# Altium footprint library Tomra_Cadstar_Footprints.PcbLib: 380 footprints (part 16 of 24)
Each footprint in its own frame and in the unit in brackets; x right, y up, seen from the top. Pads: shape width x height; smd on the part's side, far side on the other; paste and mask are expansions set on the pad; w line width, h text height; cw(c..) or ccw(c..) is an arc to the next point about the centre after c.
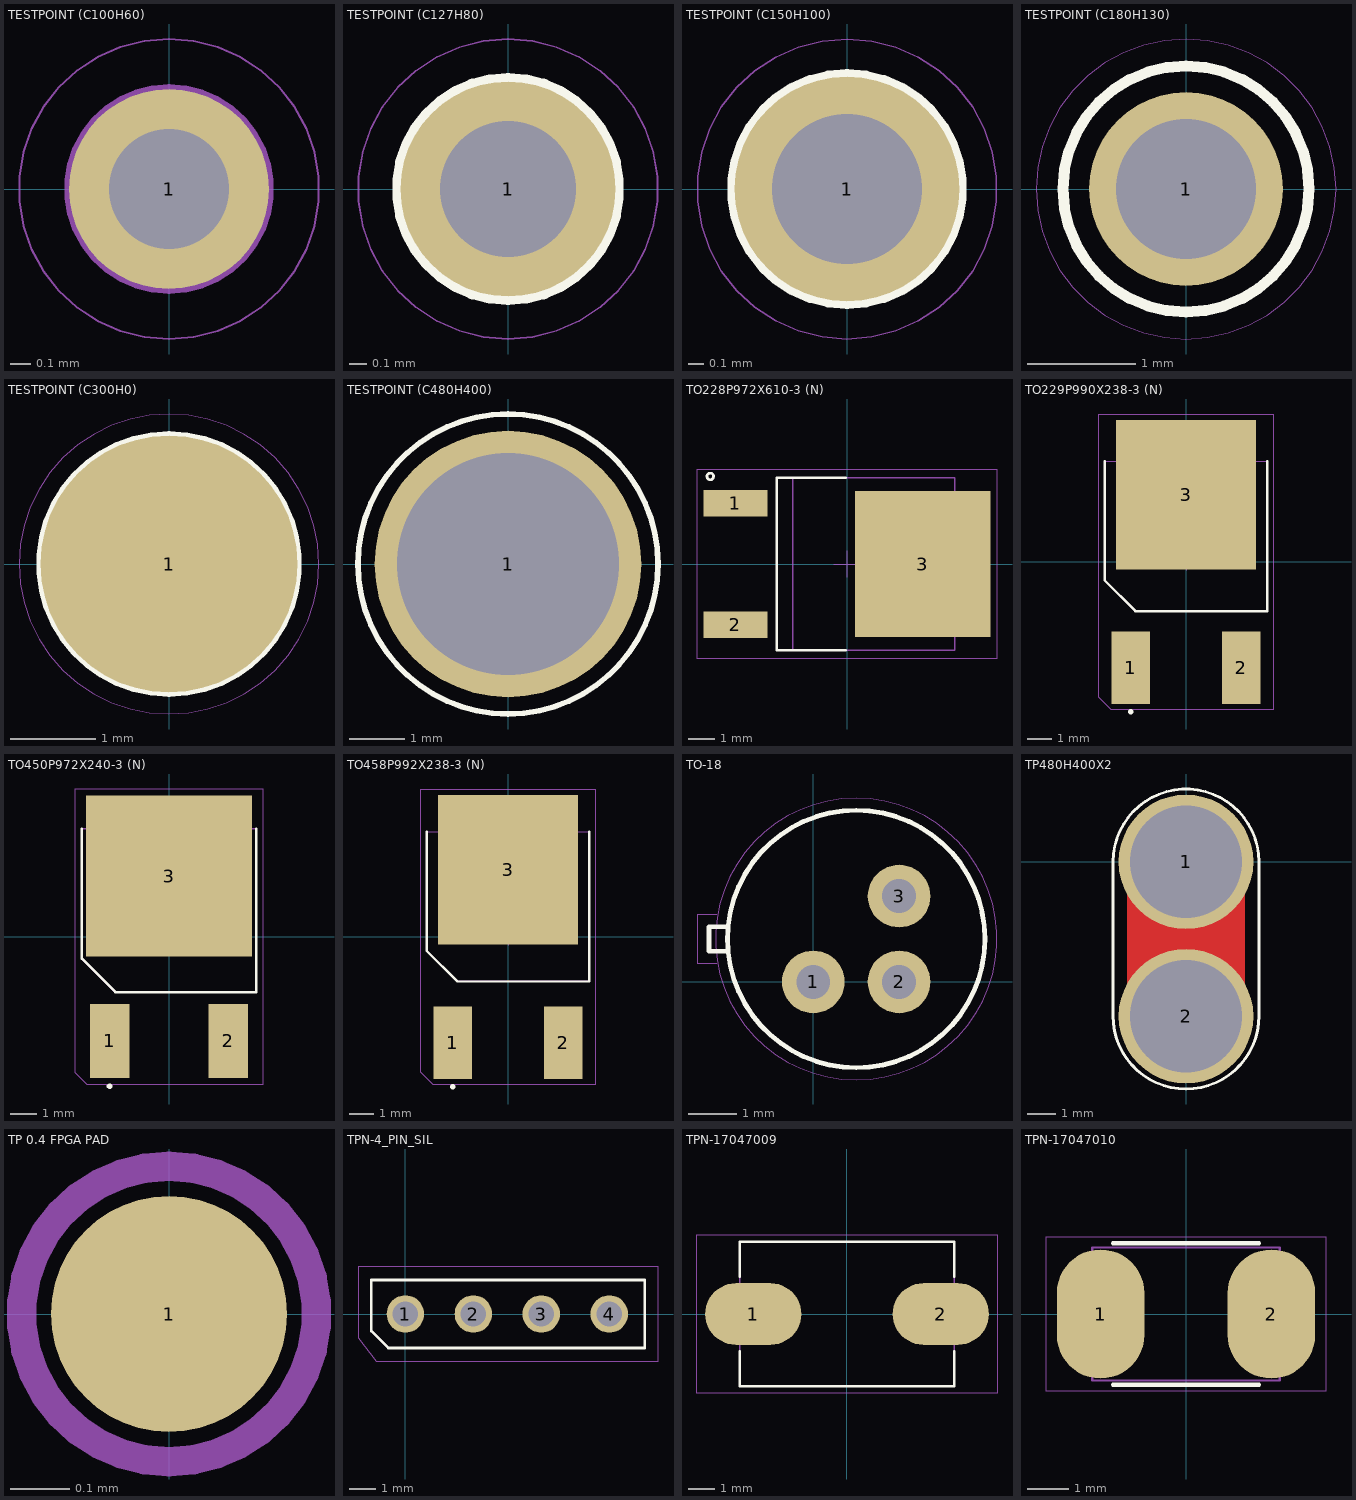
[diagram p15: the footprints below, top view; thin cyan lines are the x and y axes]

## TESTPOINT (C100H60) [mm]
pads (1):
  round 1 / inner round 1.524 / far side round 1 hole 0.6 paste+0 mask+0: 1(0,0)
Top Silk:
  text ".Designator" at 0,0 h0.7
Top Assembly:
  lines w0.05: 0,-0.5 cw(c0,0) 0,0.5 cw(c0,0) 0,-0.5
Top Placement:
  lines w0.01: 0,-0.75 cw(c0,0) 0,0.75 cw(c0,0) 0,-0.75

## TESTPOINT (C127H80) [mm]
pads (1):
  round 1.27 / inner round 1.524 / far side round 1.27 hole 0.8 paste+0 mask+0: 1(0,0)
Top Silk:
  lines w0.1: 0,-0.635 cw(c0,0) 0,0.635 cw(c0,0) 0,-0.635
  text ".Designator" at 0,0 h0.7
Top Assembly:
  lines w0.05: 0,-0.635 cw(c0,0) 0,0.635 cw(c0,0) 0,-0.635
Top Placement:
  lines w0.01: 0,-0.885 cw(c0,0) 0,0.885 cw(c0,0) 0,-0.885

## TESTPOINT (C150H100) [mm]
pads (1):
  round 1.5 / inner round 1.524 / far side round 1.5 hole 1 paste+0 mask+0: 1(0,0)
Top Silk:
  lines w0.1: 0,-0.75 cw(c0,0) 0,0.75 cw(c0,0) 0,-0.75
  text ".Designator" at 0,0 h0.7
Top Assembly:
  lines w0.05: 0,-0.75 cw(c0,0) 0,0.75 cw(c0,0) 0,-0.75
Top Placement:
  lines w0.01: 0,-1 cw(c0,0) 0,1 cw(c0,0) 0,-1

## TESTPOINT (C180H130) [mm]
pads (1):
  round 1.8 / inner round 1.524 / far side round 1.8 hole 1.3 paste+0 mask+0: 1(0,0)
Top Silk:
  lines w0.1: 0,-1.143 cw(c0,0) 0,1.143 cw(c0,0) 0,-1.143
  text ".Designator" at 0,0 h0.7
Top Assembly:
  lines w0.05: 0,-1.143 cw(c0,0) 0,1.143 cw(c0,0) 0,-1.143
Top Placement:
  lines w0.01: 0,-1.393 cw(c0,0) 0,1.393 cw(c0,0) 0,-1.393

## TESTPOINT (C300H0) [mm]
pads (1):
  round 3 smd paste-3 mask+0: 1(0,0)
Top Silk:
  lines w0.1: 0,-1.5 cw(c0,0) 0,1.5 cw(c0,0) 0,-1.5
  text ".Designator" at 0,0 h0.7
Top Assembly:
  lines w0.05: 0,-1.5 cw(c0,0) 0,1.5 cw(c0,0) 0,-1.5
Top Placement:
  lines w0.01: 0,-1.75 cw(c0,0) 0,1.75 cw(c0,0) 0,-1.75

## TESTPOINT (C480H400) [mm]
pads (1):
  round 4.8 / inner round 1.524 / far side round 4.8 hole 4 paste+0 mask+0: 1(0,0)
Top Silk:
  lines w0.05: 0,-2.7 cw(c0,0) 0,2.7 cw(c0,0) 0,-2.7
  lines w0.1: 0,-2.7 cw(c0,0) 0,2.7 cw(c0,0) 0,-2.7
Top Assembly:
  lines w0.05: 0,-2.7 cw(c0,0) 0,2.7 ; 0,-2.7 ccw(c0,0) 0,2.7 ; 0,-2.7 cw(c0,0) 0,2.7 ; 0,-2.7 ccw(c0,0) 0,2.7
  text ".Designator" at -2.3,2.68 h0.7
Top Placement:
  lines w0.01: 0,-2.7 cw(c0,0) 0,2.7 cw(c0,0) 0,-2.7

## TO228P972X610-3 (N) [mm]
height 2.4
pads (3):
  rect 2.4x1 smd paste+0 mask+0: 1(-4.2,2.28) 2(-4.2,-2.28)
  rect 5.1x5.5 smd paste+0 mask+0: 3(2.85,0)
Top Silk:
  lines w0.1: -0.05,-3.25 -2.65,-3.25 -2.65,3.25 -0.05,3.25 ; -5.275,3.3 cw(c-5.15,3.3) -5.025,3.3 cw(c-5.15,3.3) -5.275,3.3
  text ".Designator" at -3.599,-0.35 h0.7
Top Assembly:
  lines w0.05: 4.062,-2.65 4.59,-2.65 4.862,-2.05 4.862,2.05 4.59,2.65 4.062,2.65 ; -2.038,-3.25 4.062,-3.25 4.062,3.25 -2.038,3.25 -2.038,-3.25
Top Placement:
  lines w0.01: -0.5,0 0.5,0 ; 0,-0.5 0,0.5 ; -5.65,-3.55 5.65,-3.55 5.65,3.55 -5.65,3.55 -5.65,-3.55

## TO229P990X238-3 (N) [mm]
height 2.38
pads (3):
  rect 1.6x3 smd paste+0 mask+0: 1(-2.29,-4.39) 2(2.29,-4.39)
  rect 5.8x6.2 smd paste+0 mask+0: 3(0,2.79)
Top Silk:
  region: -2.39,-6.21 -2.39,-6.169 -2.331,-6.11 -2.249,-6.11 -2.19,-6.169 -2.19,-6.21 -2.19,-6.251 -2.249,-6.31 -2.331,-6.31 -2.39,-6.251
  lines w0.1: -3.37,4.182 -3.37,-0.768 -2.1,-2.038 3.37,-2.038 3.37,4.182
  text ".Designator" at 0,0 h0.7
Top Paste:
  region: 2.615,-0.02 1.265,-0.02 1.265,1.46 2.615,1.46
  region: 2.615,2.05 1.265,2.05 1.265,3.53 2.615,3.53
  region: 2.615,4.12 1.265,4.12 1.265,5.6 2.615,5.6
  region: 0.675,-0.02 -0.675,-0.02 -0.675,1.46 0.675,1.46
  region: 0.675,2.05 -0.675,2.05 -0.675,3.53 0.675,3.53
  region: 0.675,4.12 -0.675,4.12 -0.675,5.6 0.675,5.6
  region: -1.265,-0.02 -2.615,-0.02 -2.615,1.46 -1.265,1.46
  region: -1.265,2.05 -2.615,2.05 -2.615,3.53 -1.265,3.53
  region: -1.265,4.12 -2.615,4.12 -2.615,5.6 -1.265,5.6
Top Assembly:
  lines w0.05: -3.37,-0.768 -2.1,-2.038 3.37,-2.038 3.37,4.182 -3.37,4.182 -3.37,-0.768
Top Placement:
  lines w0.01: -3.62,-5.62 -3.1,-6.14 3.62,-6.14 3.62,6.14 -3.62,6.14 -3.62,-5.62
  lines w0.05: -0.35,0 0.35,0 ; 0,-0.35 0,0.35 ; -0.25,0 cw(c0,0) 0.25,0 cw(c0,0) -0.25,0

## TO450P972X240-3 (N) [mm]
height 2.4
pads (3):
  rect 1.5x2.8 smd paste+0 mask+0: 1(-2.25,-3.95) 2(2.25,-3.95)
  rect 6.3x6.1 smd paste+0 mask+0: 3(0,2.3)
Top Silk:
  region: -2.35,-5.67 -2.35,-5.629 -2.291,-5.57 -2.209,-5.57 -2.15,-5.629 -2.15,-5.67 -2.15,-5.711 -2.209,-5.77 -2.291,-5.77 -2.35,-5.711
  lines w0.1: -3.3,4.1 -3.3,-0.83 -2.03,-2.1 3.3,-2.1 3.3,4.1
  text ".Designator" at -3.55,5.6 h0.7
Top Assembly:
  lines w0.05: -3.3,-0.83 -2.03,-2.1 3.3,-2.1 3.3,4.1 -3.3,4.1 -3.3,-0.83
Top Placement:
  lines w0.01: -0.35,0 0.35,0 ; 0,-0.35 0,0.35 ; -3.55,-5.15 -3.1,-5.6 3.55,-5.6 3.55,5.6 -3.55,5.6 -3.55,-5.15 ; -0.25,0 cw(c0,0) 0.25,0 cw(c0,0) -0.25,0

## TO458P992X238-3 (N) [mm]
height 2.38
pads (3):
  rect 1.6x3 smd paste+0 mask+0: 1(-2.29,-4.39) 2(2.29,-4.39)
  rect 5.8x6.2 smd paste+0 mask+0: 3(0,2.79)
Top Silk:
  region: -2.39,-6.21 -2.39,-6.169 -2.331,-6.11 -2.249,-6.11 -2.19,-6.169 -2.19,-6.21 -2.19,-6.251 -2.249,-6.31 -2.331,-6.31 -2.39,-6.251
  lines w0.1: -3.37,4.372 -3.37,-0.577 -2.1,-1.847 3.37,-1.847 3.37,4.372
  text ".Designator" at 0,0 h0.7
Top Paste:
  region: 2.615,-0.02 1.265,-0.02 1.265,1.46 2.615,1.46
  region: 2.615,2.05 1.265,2.05 1.265,3.53 2.615,3.53
  region: 2.615,4.12 1.265,4.12 1.265,5.6 2.615,5.6
  region: 0.675,-0.02 -0.675,-0.02 -0.675,1.46 0.675,1.46
  region: 0.675,2.05 -0.675,2.05 -0.675,3.53 0.675,3.53
  region: 0.675,4.12 -0.675,4.12 -0.675,5.6 0.675,5.6
  region: -1.265,-0.02 -2.615,-0.02 -2.615,1.46 -1.265,1.46
  region: -1.265,2.05 -2.615,2.05 -2.615,3.53 -1.265,3.53
  region: -1.265,4.12 -2.615,4.12 -2.615,5.6 -1.265,5.6
Top Assembly:
  lines w0.05: -3.37,-0.577 -2.1,-1.847 3.37,-1.847 3.37,4.372 -3.37,4.372 -3.37,-0.577
Top Placement:
  lines w0.01: -3.62,-5.62 -3.1,-6.14 3.62,-6.14 3.62,6.14 -3.62,6.14 -3.62,-5.62
  lines w0.05: -0.35,0 0.35,0 ; 0,-0.35 0,0.35 ; -0.25,0 cw(c0,0) 0.25,0 cw(c0,0) -0.25,0

## TO-18 [mm]
height 8
pads (3):
  round 1.3 / inner round 1.524 / far side round 1.3 hole 0.7 paste+0 mask+0: 1(0,0) 2(1.778,0) 3(1.778,1.778)
Top Silk:
  lines w0.1: -1.778,0.635 -2.159,0.635 -2.159,1.143 -1.778,1.143 ; 0.889,-1.778 cw(c0.889,0.889) 0.889,3.556 cw(c0.889,0.889) 0.889,-1.778
  text ".Designator" at -2.71,0.539 h0.7
Top Assembly:
  lines w0.05: -1.778,0.635 -2.159,0.635 -2.159,1.143 -1.778,1.143 ; 0.889,-1.778 cw(c0.889,0.889) 0.889,3.556 cw(c0.889,0.889) 0.889,-1.778
Top Placement:
  lines w0.01: -1.995,0.39 -2.409,0.385 -2.409,1.393 -1.995,1.39 ; 0.889,-2.028 cw(c0.889,0.889) 0.889,3.806 cw(c0.889,0.889) 0.889,-2.028

## TP480H400X2 [mm]
height 0.1
pads (2):
  round 4.8 / inner round 1.524 / far side round 4.8 hole 4 paste+0 mask+0: 1(0,0) 2(0,-5.5)
Top Elec:
  region: -2.1,-5.5 -2.099,-5.706 -2.016,-6.11 -1.857,-6.49 -1.627,-6.832 -1.334,-7.122 -0.991,-7.35 -0.61,-7.507 -0.206,-7.588 0.206,-7.588 0.61,-7.507 0.991,-7.35 1.334,-7.122 1.627,-6.832 1.857,-6.49 2.016,-6.11 2.099,-5.706 2.1,-5.5 2.1,0 2.1,0.207 2.019,0.613 1.861,0.995 1.631,1.339 1.339,1.631 0.995,1.861 0.613,2.019 0.207,2.1 -0.207,2.1 -0.613,2.019 -0.995,1.861 -1.339,1.631 -1.631,1.339 -1.861,0.995 -2.019,0.613 -2.1,0.207 -2.1,0
Bottom Elec:
  region: -2.1,-5.5 -2.099,-5.706 -2.016,-6.11 -1.857,-6.49 -1.627,-6.832 -1.334,-7.122 -0.991,-7.35 -0.61,-7.507 -0.206,-7.588 0.206,-7.588 0.61,-7.507 0.991,-7.35 1.334,-7.122 1.627,-6.832 1.857,-6.49 2.016,-6.11 2.099,-5.706 2.1,-5.5 2.1,0 2.1,0.207 2.019,0.613 1.861,0.995 1.631,1.339 1.339,1.631 0.995,1.861 0.613,2.019 0.207,2.1 -0.207,2.1 -0.613,2.019 -0.995,1.861 -1.339,1.631 -1.631,1.339 -1.861,0.995 -2.019,0.613 -2.1,0.207 -2.1,0
Top Silk:
  lines w0.1: -2.6,-5.488 ccw(c0,-5.493) 2.6,-5.488 2.6,0.004 ccw(c0,-0.004) -2.6,0.004 -2.6,-5.487
Top Solder Resist:
  region: -2.3,-5.5 -2.3,-5.727 -2.213,-6.172 -2.04,-6.591 -1.788,-6.968 -1.467,-7.289 -1.091,-7.542 -0.672,-7.715 -0.227,-7.804 0.227,-7.804 0.672,-7.715 1.091,-7.542 1.467,-7.289 1.788,-6.968 2.04,-6.591 2.213,-6.172 2.3,-5.727 2.3,-5.5 2.3,0 2.3,0.227 2.213,0.672 2.04,1.091 1.788,1.468 1.467,1.789 1.091,2.042 0.672,2.215 0.227,2.304 -0.227,2.304 -0.672,2.215 -1.091,2.042 -1.467,1.789 -1.788,1.468 -2.04,1.091 -2.213,0.672 -2.3,0.227 -2.3,0
Bottom Solder Resist:
  region: -2.3,-5.5 -2.3,-5.727 -2.213,-6.172 -2.04,-6.591 -1.788,-6.968 -1.467,-7.289 -1.091,-7.542 -0.672,-7.715 -0.227,-7.804 0.227,-7.804 0.672,-7.715 1.091,-7.542 1.467,-7.289 1.788,-6.968 2.04,-6.591 2.213,-6.172 2.3,-5.727 2.3,-5.5 2.3,0 2.3,0.227 2.213,0.672 2.04,1.091 1.788,1.468 1.467,1.789 1.091,2.042 0.672,2.215 0.227,2.304 -0.227,2.304 -0.672,2.215 -1.091,2.042 -1.467,1.789 -1.788,1.468 -2.04,1.091 -2.213,0.672 -2.3,0.227 -2.3,0
Top Assembly:
  lines w0.05: -2.6,-5.488 ccw(c0,-5.493) 2.6,-5.488 2.6,0.004 ccw(c0,-0.004) -2.6,0.004 -2.6,-5.487
  text ".Designator" at -2,2.5 h0.7
Top Placement:
  lines w0.01: -2.6,-5.488 ccw(c0,-5.493) 2.6,-5.488 2.6,0.004 ccw(c0,-0.004) -2.6,0.004 -2.6,-5.487

## TP 0.4 FPGA PAD [mm]
pads (1):
  round 0.4 smd paste+0 mask+0: 1(0,0)
Top Silk:
  text ".Designator" at 0,0.56 h0.7
Top Assembly:
  lines w0.05: 0,-0.25 cw(c0,0) 0,0.25 cw(c0,0) 0,-0.25
Top Placement:
  lines w0.01: 0,-0.25 cw(c0,0) 0,0.25 cw(c0,0) 0,-0.25

## TPN-4_PIN_SIL [mm]
height 9
pads (4):
  round 1.4 / inner round 1.524 / far side round 1.4 hole 0.95 paste+0 mask+0: 1(0,0) 2(2.54,0) 3(5.08,0) 4(7.62,0)
Top Silk:
  lines w0.1: -1.27,-0.635 -0.635,-1.27 8.94,-1.27 8.94,1.27 -1.27,1.27 -1.27,-0.635
  text ".Designator" at 0,0 h0.7
Top Assembly:
  lines w0.05: -1.27,-0.635 -0.635,-1.27 8.94,-1.27 8.94,1.27 -1.27,1.27 -1.27,-0.635
Top Placement:
  lines w0.01: -1.77,-0.885 -1.093,-1.77 9.44,-1.77 9.44,1.77 -1.77,1.77 -1.77,-0.885

## TPN-17047009 [mm]
height 3
pads (2):
  oval 3.6x2.3 smd paste+0 mask+0: 1(-3.5,0) 2(3.5,0)
Top Silk:
  lines w0.1: -4,-1.4 -4,-2.7 4,-2.7 4,-1.4 ; -4,1.4 -4,2.7 4,2.7 4,1.4
  text ".Designator" at -3.9,3 h0.7
Top Assembly:
  lines w0.05: -4,-1.5 -4,2.7 4,2.7 4,-1.4 4,-2.7 -4,-2.7 -4,-1.4
Top Placement:
  lines w0.01: -5.6,-2.95 5.6,-2.95 5.6,2.95 -5.6,2.95 -5.6,-2.95

## TPN-17047010 [mm]
pads (2):
  oval 2.1x3.1 smd paste+0 mask+0: 1(-2.05,0) 2(2.05,0)
Top Silk:
  lines w0.1: -1.75,-1.7 1.75,-1.7 ; -1.75,1.7 1.75,1.7
  text ".Designator" at -2.02,1.945 h0.7
Top Assembly:
  lines w0.05: -2.25,-1.6 2.25,-1.6 2.25,1.6 -2.25,1.6 -2.25,-1.6
Top Placement:
  lines w0.01: -3.35,-1.85 3.35,-1.85 3.35,1.85 -3.35,1.85 -3.35,-1.85